# Altium footprint library Power-second_Ver0.1.PcbLib: 16 footprints
Each footprint in its own frame and in the unit in brackets; x right, y up, seen from the top. Pads: shape width x height; smd on the part's side, far side on the other; paste and mask are expansions set on the pad; w line width, h text height; cw(c..) or ccw(c..) is an arc to the next point about the centre after c.
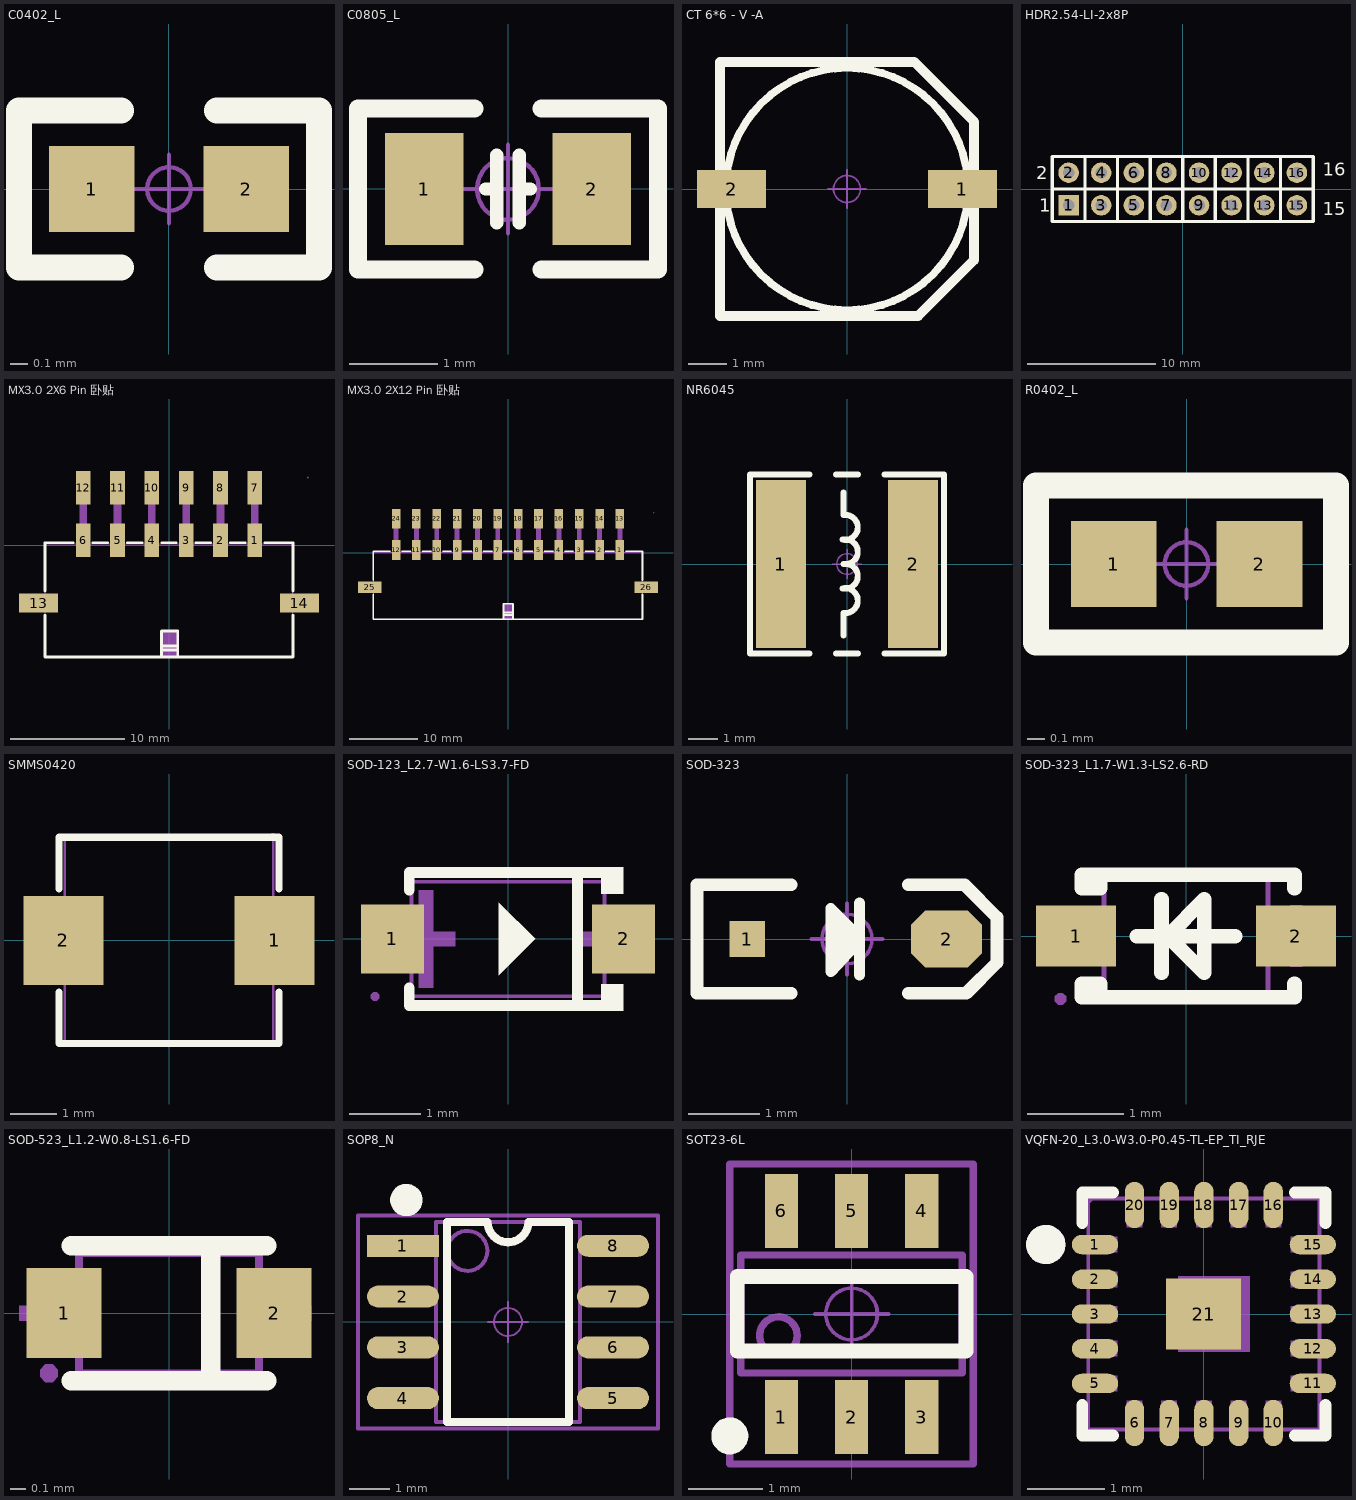
[diagram p0: the footprints below, top view; thin cyan lines are the x and y axes]

## C0402_L [mm] "贴片MLCC电容"
height 1.1
pads (2):
  rect 0.5x0.5 smd: 1(-0.45,0) 2(0.45,0)
Top Overlay:
  lines w0.152: -0.279,-0.457 -0.875,-0.457 -0.875,0.457 -0.279,0.457 ; 0.279,-0.457 0.875,-0.457 0.875,0.457 0.279,0.457
Mechanical 15:
  circle w0.025: c0,0 r0.127
  lines w0.025: -0.2,0 0.2,0 ; 0,-0.2 0,0.2
3D body "C0402-B-2S.stp": height 0.5, standoff 0, extent -0.5,-0.25 0.5,0.25

## C0805_L [mil] "贴片MLCC电容"
height 19.68
pads (2):
  rect 35x50 smd: 1(-37.4,0) 2(37.4,0)
Top Overlay:
  lines w6: -10,0 -5,0 ; -5,-15 -5,15 ; 5,-15 5,15 ; 5,0 10,0
  lines w8: -15,-36 -66.93,-36 -66.93,36 -15,36 ; 15,-36 66.93,-36 66.93,36 15,36
Mechanical 15:
  circle w1.97: c0,0 r13.78
  circle w1.97: c0,0 r13.78
  lines w1.97: -19.68,0 19.68,0 -19.68,0 ; 0,-19.68 0,19.68 0,-19.68
3D body "C0805H13-2S.stp": height 51.18, standoff -0.04, extent -39.36,-25.58 39.38,25.6

## CT 6*6 - V -A [mm] "直径6mm，高6mm"
height 1.1
pads (2):
  rect 1.8x1 smd: 1(3,0) 2(-3,0)
Top Overlay:
  circle w0.2: c0,0 r3.15
  lines w0.254: -3.3,-3.3 1.85,-3.3 3.3,-1.85 3.3,1.75 1.75,3.3 -3.3,3.3 -3.3,-3.3
Mechanical 15:
  circle w0.05: c0,0 r0.35
  lines w0.05: -0.5,0 0.5,0 ; 0,-0.5 0,0.5
3D body "CT 6X6-V.STEP": height 6, standoff -0.01, extent -3.5,-3.15 3.5,3.15

## HDR2.54-LI-2x8P [mm] "双排排针，8x2脚"
pads (16):
  rect 1.6x1.6 hole 0.9: 1(-8.89,-1.27)
  round 1.6 hole 0.9: 2(-8.89,1.27) 3(-6.35,-1.27) 4(-6.35,1.27) 5(-3.81,-1.27) 6(-3.81,1.27) 7(-1.27,-1.27) 8(-1.27,1.27) 9(1.27,-1.27) 10(1.27,1.27) 11(3.81,-1.27) 12(3.81,1.27) 13(6.35,-1.27) 14(6.35,1.27) 15(8.89,-1.27) 16(8.89,1.27)
Top Overlay:
  lines w0.254: -10.16,0 10.16,0 ; -7.62,-2.54 -7.62,2.54 ; -5.08,-2.54 -5.08,2.54 ; -2.54,-2.54 -2.54,2.54 ; 0,-2.54 0,2.54 ; 2.54,-2.54 2.54,2.54 ; 5.08,-2.54 5.08,2.54 ; 7.62,-2.54 7.62,2.54 ; 10.16,-2.54 -10.16,-2.54 -10.16,2.54 10.16,2.54 ; 10.16,-2.54 10.16,2.54 ; 10.16,-2.54 10.16,2.54
  text "15" at 10.922,-2.032 h1.02
  text "16" at 10.922,1.016 h1.02
  text "1" at -11.176,-1.778 h1.02
  text "2" at -11.43,0.762 h1.02
3D body "HDR2.54-1x2P.STEP": height 8.5, standoff -3, extent 7.62,-2.54 10.16,2.54
3D body "HDR2.54-1x2P.STEP": height 8.5, standoff -3, extent 2.54,-2.54 5.08,2.54
3D body "HDR2.54-1x2P.STEP": height 8.5, standoff -3, extent 5.08,-2.54 7.62,2.54
3D body "HDR2.54-1x2P.STEP": height 8.5, standoff -3, extent -5.08,-2.54 -2.54,2.54
3D body "HDR2.54-1x2P.STEP": height 8.5, standoff -3, extent -2.54,-2.54 0,2.54
3D body "HDR2.54-1x2P.STEP": height 8.5, standoff -3, extent -10.16,-2.54 -7.62,2.54
3D body "HDR2.54-1x2P.STEP": height 8.5, standoff -3, extent -7.62,-2.54 -5.08,2.54
3D body "HDR2.54-1x2P.STEP": height 8.5, standoff -3, extent 0,-2.54 2.54,2.54

## MX3.0 2X6 Pin 卧贴 [mm] "MX3.0 2X6 Pin 卧贴"
pads (14):
  rect 1.27x2.92 smd paste+0: 1(7.5,0.43) 2(4.5,0.43) 3(1.5,0.43) 4(-1.5,0.43) 5(-4.5,0.43) 6(-7.5,0.43) 7(7.5,5.05) 8(4.5,5.05) 9(1.5,5.05) 10(-1.5,5.05) 11(-4.5,5.05) 12(-7.5,5.05)
  rect 3.43x1.65 smd paste+0: 13(-11.395,-5.05) 14(11.395,-5.05)
Top Overlay:
  lines w0.254: -10.83,-6.106 -10.83,-9.77 10.83,-9.77 10.83,-6.106 ; -10.83,-3.994 -10.83,0.23 -8.366,0.23 ; -6.634,0.23 -5.366,0.23 ; -3.634,0.23 -2.366,0.23 ; -0.664,-9.77 -0.639,-7.47 0.761,-7.47 0.761,-9.77 ; -0.639,-9.135 0.761,-9.135 ; -0.639,-8.779 0.761,-8.779 ; -0.634,0.23 0.634,0.23 ; 2.366,0.23 3.634,0.23 ; 5.366,0.23 6.634,0.23 ; 8.366,0.23 10.83,0.23 10.83,-3.994
Mechanical 4:
  region: -0.65,-9.75 -0.65,-7.45 0.75,-7.45 0.75,-9.75
Mechanical 7:
  lines w0.051: -10.8,-9.77 10.8,-9.77 10.8,0.13 -10.8,0.13 -10.8,-9.77
Mechanical 8:
  region: -7.82,5.93 -7.18,5.93 -7.18,0.115 -7.82,0.115
  region: -4.82,5.93 -4.18,5.93 -4.18,0.115 -4.82,0.115
  region: -1.82,5.93 -1.18,5.93 -1.18,0.115 -1.82,0.115
  region: 1.18,5.93 1.82,5.93 1.82,0.115 1.18,0.115
  region: 4.18,5.93 4.82,5.93 4.82,0.115 4.18,0.115
  region: 7.18,5.93 7.82,5.93 7.82,0.115 7.18,0.115
Mechanical 9:
  region: 12.19,5.93 12.19,5.905 12.155,5.87 12.105,5.87 12.07,5.905 12.07,5.93 12.07,5.955 12.105,5.99 12.155,5.99 12.19,5.955 12.19,5.93
Mechanical 10:
  region: -10.13,-4.4 -10.13,-5.7 -12.13,-5.7 -12.13,-4.4
  region: 10.13,-5.7 10.13,-4.4 12.13,-4.4 12.13,-5.7
  region: 7.18,1.23 7.82,1.23 7.82,-0.77 7.18,-0.77
  region: 4.18,1.23 4.82,1.23 4.82,-0.77 4.18,-0.77
  region: 4.18,5.93 4.82,5.93 4.82,3.93 4.18,3.93
  region: 1.18,5.93 1.82,5.93 1.82,3.93 1.18,3.93
  region: 1.18,1.23 1.82,1.23 1.82,-0.77 1.18,-0.77
  region: -1.82,1.23 -1.18,1.23 -1.18,-0.77 -1.82,-0.77
  region: -4.82,1.23 -4.18,1.23 -4.18,-0.77 -4.82,-0.77
  region: -7.82,1.23 -7.18,1.23 -7.18,-0.77 -7.82,-0.77
  region: 7.18,5.93 7.82,5.93 7.82,3.93 7.18,3.93
  region: -1.82,5.93 -1.18,5.93 -1.18,3.93 -1.82,3.93
  region: -4.82,5.93 -4.18,5.93 -4.18,3.93 -4.82,3.93
  region: -7.82,5.93 -7.18,5.93 -7.18,3.93 -7.82,3.93
3D body "未命名-EasyEDA PCB Model~QQvAU1~CONN-SMD_12P-P3.00_XKB_C3030WRS-2X06D-LPSW~CONN-SMD_12P-P3.00_XKB_C3030WRS-2X06D-LPSW~irgX.step": height 8.81, standoff -0.01, extent -12.15,-9.678 12.1,6.122

## MX3.0 2X12 Pin 卧贴 [mm] "MX3.0 2X12 Pin 卧贴"
pads (26):
  rect 1.27x2.92 smd paste+0: 1(16.5,0.43) 2(13.5,0.43) 3(10.5,0.43) 4(7.5,0.43) 5(4.5,0.43) 6(1.5,0.43) 7(-1.5,0.43) 8(-4.5,0.43) 9(-7.5,0.43) 10(-10.5,0.43) 11(-13.5,0.43) 12(-16.5,0.43) 13(16.5,5.05) 14(13.5,5.05) 15(10.5,5.05) 16(7.5,5.05) 17(4.5,5.05) 18(1.5,5.05) 19(-1.5,5.05) 20(-4.5,5.05) 21(-7.5,5.05) 22(-10.5,5.05) 23(-13.5,5.05) 24(-16.5,5.05)
  rect 3.43x1.65 smd paste+0: 25(-20.395,-5.05) 26(20.395,-5.05)
Top Overlay:
  lines w0.254: -19.848,-6.106 -19.848,-9.77 19.812,-9.77 19.812,-6.106 ; -19.848,-3.994 -19.848,0.23 -17.366,0.23 ; -15.634,0.23 -14.366,0.23 ; -12.634,0.23 -11.366,0.23 ; -9.634,0.23 -8.366,0.23 ; -6.634,0.23 -5.366,0.23 ; -3.634,0.23 -2.366,0.23 ; -0.677,-9.77 -0.651,-7.47 0.749,-7.47 0.749,-9.77 ; -0.651,-9.135 0.749,-9.135 ; -0.651,-8.779 0.749,-8.779 ; -0.634,0.23 0.634,0.23 ; 2.366,0.23 3.634,0.23 ; 5.366,0.23 6.634,0.23 ; 8.367,0.23 9.634,0.23 ; 11.367,0.23 12.634,0.23 ; 14.366,0.23 15.634,0.23 ; 17.348,0.23 19.812,0.23 19.812,-3.994
Mechanical 4:
  region: -0.6,-7.5 -0.6,-9.7 0.7,-9.7 0.7,-7.5
Mechanical 7:
  lines w0.051: -19.8,-9.77 -19.8,0.13 19.8,0.13 19.8,-9.77 -19.8,-9.77
Mechanical 8:
  region: -16.82,5.93 -16.18,5.93 -16.18,0.03 -16.82,0.03
  region: -13.82,5.93 -13.18,5.93 -13.18,0.03 -13.82,0.03
  region: -10.82,5.93 -10.18,5.93 -10.18,0.03 -10.82,0.03
  region: -7.82,5.93 -7.18,5.93 -7.18,0.03 -7.82,0.03
  region: -4.82,5.93 -4.18,5.93 -4.18,0.03 -4.82,0.03
  region: -1.82,5.93 -1.18,5.93 -1.18,0.03 -1.82,0.03
  region: 1.18,5.93 1.82,5.93 1.82,0.03 1.18,0.03
  region: 4.18,5.93 4.82,5.93 4.82,0.03 4.18,0.03
  region: 7.18,5.93 7.82,5.93 7.82,0.03 7.18,0.03
  region: 10.18,5.93 10.82,5.93 10.82,0.03 10.18,0.03
  region: 13.18,5.93 13.82,5.93 13.82,0.03 13.18,0.03
  region: 16.18,5.93 16.82,5.93 16.82,0.03 16.18,0.03
Mechanical 9:
  region: 21.555,5.93 21.555,5.905 21.52,5.87 21.47,5.87 21.435,5.905 21.435,5.93 21.435,5.955 21.47,5.99 21.52,5.99 21.555,5.955 21.555,5.93
Mechanical 10:
  region: -18.995,-4.4 -18.995,-5.7 -21.495,-5.7 -21.495,-4.4
  region: -13.82,1.23 -13.18,1.23 -13.18,-0.77 -13.82,-0.77
  region: -16.82,1.23 -16.18,1.23 -16.18,-0.77 -16.82,-0.77
  region: -7.82,5.93 -7.18,5.93 -7.18,3.93 -7.82,3.93
  region: -10.82,5.93 -10.18,5.93 -10.18,3.93 -10.82,3.93
  region: -13.82,5.93 -13.18,5.93 -13.18,3.93 -13.82,3.93
  region: -16.82,5.93 -16.18,5.93 -16.18,3.93 -16.82,3.93
  region: -10.82,1.23 -10.18,1.23 -10.18,-0.77 -10.82,-0.77
  region: -7.82,1.23 -7.18,1.23 -7.18,-0.77 -7.82,-0.77
  region: -1.82,1.23 -1.18,1.23 -1.18,-0.77 -1.82,-0.77
  region: -4.82,1.23 -4.18,1.23 -4.18,-0.77 -4.82,-0.77
  region: 4.18,5.93 4.82,5.93 4.82,3.93 4.18,3.93
  region: 1.18,5.93 1.82,5.93 1.82,3.93 1.18,3.93
  region: -1.82,5.93 -1.18,5.93 -1.18,3.93 -1.82,3.93
  region: -4.82,5.93 -4.18,5.93 -4.18,3.93 -4.82,3.93
  region: 1.18,1.23 1.82,1.23 1.82,-0.77 1.18,-0.77
  region: 4.18,1.23 4.82,1.23 4.82,-0.77 4.18,-0.77
  region: 10.18,1.23 10.82,1.23 10.82,-0.77 10.18,-0.77
  region: 7.181,1.23 7.82,1.23 7.82,-0.77 7.181,-0.77
  region: 16.18,5.93 16.82,5.93 16.82,3.93 16.18,3.93
  region: 13.18,5.93 13.82,5.93 13.82,3.93 13.18,3.93
  region: 10.18,5.93 10.82,5.93 10.82,3.93 10.18,3.93
  region: 7.18,5.93 7.82,5.93 7.82,3.93 7.18,3.93
  region: 13.18,1.23 13.82,1.23 13.82,-0.77 13.18,-0.77
  region: 16.18,1.23 16.82,1.23 16.82,-0.77 16.18,-0.77
  region: 18.995,-5.7 18.995,-4.4 21.495,-4.4 21.495,-5.7
3D body "未命名-EasyEDA PCB Model~hzgHU1~CONN-SMD_24P-P3.00_XKB_C3030WRS-2X12D-LPSW~CONN-SMD_24P-P3.00_XKB_C3030WRS-2X12D-LPSW~DUys.step": height 8.75, standoff -0.07, extent -21.125,-9.603 21.125,6.197

## NR6045 [mm] "6.0mm*6.0mm*4.5mm(长*宽*高）"
pads (2):
  rect 1.7x5.7 smd: 1(-2.25,0) 2(2.25,0)
Top Overlay:
  lines w0.203: -1.27,-3.048 -3.302,-3.048 -3.302,3.048 -1.27,3.048 ; -0.381,-3.048 0.381,-3.048 ; -0.381,3.048 0.381,3.048 ; -0.127,-2.424 -0.127,-1.662 ccw(c-0.057,-1.244) -0.149,-0.831 ccw(c-0.057,-0.418) -0.127,0 ccw(c-0.057,0.418) -0.149,0.831 ccw(c-0.057,1.244) -0.127,1.662 -0.127,2.424 ; 1.27,-3.048 3.302,-3.048 3.302,3.048 1.27,3.048
Mechanical 15:
  circle w0.05: c0,0 r0.35
  lines w0.05: -0.5,0 0.5,0 ; 0,-0.5 0,0.5
3D body "NR6045.STEP": height 4.6, standoff 0, extent -3,-3 3,3

## R0402_L [mm] "1/16W贴片电阻"
height 1.1
pads (2):
  rect 0.5x0.5 smd: 1(-0.425,0) 2(0.425,0)
Top Overlay:
  lines w0.152: -0.878,-0.457 0.872,-0.457 0.872,0.457 -0.878,0.457 -0.878,-0.457
Mechanical 15:
  circle w0.025: c0,0 r0.127
  lines w0.025: -0.2,0 0.2,0 ; 0,-0.2 0,0.2
3D body "R0402.STEP": height 0.3, standoff 0, extent -0.5,-0.25 0.5,0.25

## SMMS0420 [mm] "贴片电感"
height 1.1
pads (2):
  rect 1.724x1.92 smd paste+0.051: 1(2.278,0) 2(-2.278,0)
Top Overlay:
  lines w0.152: -2.376,-1.112 -2.376,-2.226 2.376,-2.226 2.376,-1.112 ; -2.376,1.112 -2.376,2.226 2.376,2.226 2.376,1.112
Mechanical 7:
  lines w0.051: -2.25,-2.25 2.25,-2.25 2.25,2.25 -2.25,2.25 -2.25,-2.25
Mechanical 9:
  region: 2.31,2.25 2.31,2.225 2.275,2.19 2.225,2.19 2.19,2.225 2.19,2.25 2.19,2.275 2.225,2.31 2.275,2.31 2.31,2.275 2.31,2.25
Mechanical 10:
  region: -1.575,-0.75 -1.575,0.75 -2.375,0.75 -2.375,-0.75
  region: 1.575,-0.75 1.575,0.75 2.375,0.75 2.375,-0.75
3D body "未命名-EasyEDA PCB Model~xqLhIND-SMD_L4.5-W4.5_SMMS0420~IND-SMD_L4.8-W4.5-H2.0_SMMS0420~0TSv.step": height 2, standoff -0.01, extent -2.375,-2.25 2.375,2.25

## SOD-123_L2.7-W1.6-LS3.7-FD [mm]
pads (2):
  rect 0.88x0.96 smd paste+0.051: 1(-1.61,0) 2(1.61,0)
Top Overlay:
  region: 1.3,-1.003 1.3,-0.632 1.605,-0.633 1.605,-1.003
  region: 1.3,1.002 1.3,0.632 1.605,0.632 1.605,1.002
  region: 0.381,0 -0.127,0.508 -0.127,-0.508
  lines w0.152: -1.376,-0.683 -1.376,-0.926 1.376,-0.926 ; -1.376,0.683 -1.376,0.926 1.376,0.926 ; 0.967,-0.926 0.967,0.926
Mechanical 4:
  region: 1.805,-0.102 1.805,0.102 0.989,0.102 0.989,-0.102
  region: -1.551,-0.102 -1.551,0.102 -0.735,0.102 -0.735,-0.102
  region: -1.245,-0.68 -1.245,0.68 -1.041,0.68 -1.041,-0.68
Mechanical 7:
  lines w0.051: -1.345,-0.8 1.345,-0.8 1.345,0.8 -1.345,0.8 -1.345,-0.8
Mechanical 8:
  region: 1.511,-0.3 1.511,0.3 1.34,0.3 1.34,-0.3
  region: -1.511,0.3 -1.511,-0.3 -1.34,-0.3 -1.34,0.3
Mechanical 9:
  region: -1.791,-0.8 -1.791,-0.825 -1.826,-0.86 -1.876,-0.86 -1.911,-0.825 -1.911,-0.8 -1.911,-0.775 -1.876,-0.74 -1.826,-0.74 -1.791,-0.775 -1.791,-0.8
Mechanical 10:
  region: 1.851,-0.3 1.501,-0.3 1.501,0.3 1.851,0.3
  region: -1.851,0.3 -1.501,0.3 -1.501,-0.3 -1.851,-0.3
3D body "未命名-EasyEDA PCB Model~j9uVD2~SOD-123_L2.7-W1.6-LS3.7-FD~SOD-123_L2.7-W1.6-LS3.7-FD~uSIv.step": height 1.19, standoff 0.01, extent -1.85,-0.775 1.85,0.776

## SOD-323 [mm] "1.8x1.3X0.9mm（长宽高，不包括引脚）"
height 1.1
pads (2):
  rect 0.5x0.5 smd: 1(-1.4,0)
  oct 1x0.8 smd: 2(1.4,0)
Top Overlay:
  lines w0.152: 0.178,-0.508 0.178,0.508 ; 0.178,-0.025 -0.229,-0.457 -0.229,0.432 0.178,0.025
  lines w0.178: -0.787,-0.762 -2.108,-0.762 -2.108,0.762 -0.787,0.762 ; 0.864,-0.762 1.676,-0.762 2.108,-0.33 2.108,0.305 1.651,0.762 0.864,0.762
  lines w0.254: -0.127,0.254 -0.152,-0.178 0.025,-0.025 -0.025,0.127
Mechanical 15:
  circle w0.05: c0,0 r0.35
  lines w0.05: -0.5,0 0.5,0 ; 0,-0.5 0,0.5
3D body "SOD-323.STEP": height 1, standoff 0.04, extent -1.337,-0.631 1.311,0.669

## SOD-323_L1.7-W1.3-LS2.6-RD [mm]
pads (2):
  rect 0.83x0.63 smd paste+0: 1(-1.14,0) 2(1.14,0)
Top Overlay:
  lines w0.152: -1.003,-0.635 -0.986,-0.635 -0.986,-0.495 ; -0.986,0.495 -0.986,0.635 ; -0.508,0 0.508,0 ; -0.254,-0.381 -0.254,0.381 ; 1.125,-0.495 1.125,-0.635 0.889,-0.635 -0.889,-0.635 ; 1.125,0.495 1.125,0.635 0.889,0.635 -0.889,0.635 ; -0.889,-0.635 -0.889,-0.595 -0.889,-0.495 ; -0.889,-0.635 -1.079,-0.635 -1.079,-0.495 -0.889,-0.495 ; -0.889,-0.495 -0.889,-0.495 ; -0.889,0.635 -0.889,0.595 -0.889,0.495 -1.08,0.495 -1.08,0.635 -0.889,0.635 ; -0.191,0 0.191,0.381 0.191,-0.381 -0.191,0
Mechanical 4:
  region: -1.46,0.064 -1.46,-0.064 -0.826,-0.064 -0.826,0.064
  region: 0.826,0.064 0.826,-0.064 1.079,-0.064 1.079,-0.318 1.206,-0.318 1.206,-0.064 1.46,-0.064 1.46,0.064 1.206,0.064 1.206,0.318 1.079,0.318 1.079,0.064
Mechanical 7:
  lines w0.051: -0.85,-0.65 0.85,-0.65 0.85,0.65 -0.85,0.65 -0.85,-0.65
Mechanical 9:
  region: -1.24,-0.65 -1.24,-0.675 -1.275,-0.71 -1.325,-0.71 -1.36,-0.675 -1.36,-0.65 -1.36,-0.625 -1.325,-0.59 -1.275,-0.59 -1.24,-0.625 -1.24,-0.65
Mechanical 10:
  region: 0.8,-0.175 0.8,0.175 1.3,0.175 1.3,-0.175
  region: -1.3,-0.175 -1.3,0.175 -0.8,0.175 -0.8,-0.175
3D body "未命名-EasyEDA PCB Model~j9uVD2~SOD-323_L2.7-W1.6-LS3.7-FD~SOD-123_L2.7-W1.6-LS3.7-FD~uSIv.step": height 0.98, standoff 0.02, extent -1.275,-0.625 1.275,0.625

## SOD-523_L1.2-W0.8-LS1.6-FD [mm]
pads (2):
  rect 0.5x0.6 smd paste+0.051: 1(-0.7,0) 2(0.7,0)
Top Overlay:
  lines w0.13: -0.65,-0.45 0.65,-0.45 ; -0.65,0.45 0.65,0.45 ; 0.279,-0.444 0.279,0.406
Mechanical 4:
  region: -1,0.05 -0.65,0.05 -0.65,-0.05 -1,-0.05
  region: 0.6,0.05 0.95,0.05 0.95,-0.05 0.6,-0.05
  region: -0.876,0.266 -0.776,0.266 -0.776,-0.284 -0.876,-0.284
Mechanical 7:
  lines w0.051: -0.6,-0.4 0.6,-0.4 0.6,0.4 -0.6,0.4 -0.6,-0.4
Mechanical 9:
  region: -0.74,-0.4 -0.74,-0.425 -0.775,-0.46 -0.825,-0.46 -0.86,-0.425 -0.86,-0.4 -0.86,-0.375 -0.825,-0.34 -0.775,-0.34 -0.74,-0.375 -0.74,-0.4
Mechanical 10:
  region: -0.8,0.15 -0.508,0.15 -0.508,-0.15 -0.8,-0.15
  region: 0.8,-0.15 0.508,-0.15 0.508,0.15 0.8,0.15
3D body "未命名-EasyEDA PCB Model~j9uVD2~SOD-523_L2.7-W1.6-LS3.7-FD~SOD-123_L2.7-W1.6-LS3.7-FD~uSIv.step": height 0.72, standoff 0.01, extent -0.8,-0.419 0.8,0.381

## SOP8_N [mm] "5*6*1.8mm（长宽高）"
height 1.75
pads (8):
  rect 1.8x0.55 smd: 1(-2.625,1.905)
  oval 1.8x0.55 smd: 2(-2.625,0.635) 3(-2.625,-0.635) 4(-2.625,-1.905) 5(2.625,-1.905) 6(2.625,-0.635) 7(2.625,0.635) 8(2.625,1.905)
Top Overlay:
  circle w0.5: c-2.54,3.048 r0.155
  lines w0.2: -1.524,2.5 -1.524,-2.5 1.524,-2.5 1.524,2.5
  lines w0.203: -1.524,2.5 -0.508,2.5 ccw(c0,2.5) 0,1.992 ccw(c0,2.5) 0.508,2.5 1.524,2.5
Mechanical 13:
  circle w0.1: c-1.016,1.778 r0.5
  lines w0.1: -1.8,-2.5 -1.8,2.5 1.8,2.5 1.8,-2.5 -1.8,-2.5
Mechanical 15:
  circle w0.05: c0,0 r0.35
  lines w0.05: -0.5,0 0.5,0 ; 0,-0.5 0,0.5
  lines w0.1: -3.75,-2.667 3.75,-2.667 3.75,2.667 -3.75,2.667 -3.75,-2.667
3D body "SOP8.STEP": height 1.9, standoff 0, extent -3.003,-2.5 3.003,2.5

## SOT23-6L [mm] "3x1.6x1.1mm(长宽高)"
height 1.45
pads (6):
  rect 0.45x1 smd: 1(-0.95,-1.397) 2(0,-1.397) 3(0.95,-1.397) 4(0.95,1.397) 5(0,1.397) 6(-0.95,1.397)
Top Overlay:
  circle w0.25: c-1.65,-1.651 r0.125
  lines w0.2: -1.55,-0.5 -1.55,0.508 1.55,0.508 1.55,-0.5 -1.55,-0.5
Mechanical 13:
  circle w0.1: c-0.992,-0.292 r0.254
  lines w0.1: -1.5,-0.8 1.5,-0.8 1.5,0.8 -1.5,0.8 -1.5,-0.8
Mechanical 15:
  circle w0.05: c0,0 r0.35
  lines w0.05: -0.5,0 0.5,0 ; 0,-0.5 0,0.5
  lines w0.1: -1.65,-2.032 1.65,-2.032 1.65,2.032 -1.65,2.032 -1.65,-2.032
3D body "SOT23-6.STEP": height 1.15, standoff -0.03, extent -1.5,-1.404 1.5,1.403

## VQFN-20_L3.0-W3.0-P0.45-TL-EP_TI_RJE [mm]
height 1.1
pads (21):
  oval 0.6x0.252 smd paste-100: 1(-1.412,0.9) 2(-1.412,0.45) 3(-1.412,0) 4(-1.412,-0.45) 5(-1.412,-0.9) 11(1.412,-0.9) 12(1.412,-0.45) 13(1.412,0) 14(1.412,0.45) 15(1.412,0.9)
  oval 0.252x0.6 smd paste-100: 6(-0.9,-1.412) 7(-0.45,-1.412) 8(0,-1.412) 9(0.45,-1.412) 10(0.9,-1.412) 16(0.9,1.412) 17(0.45,1.412) 18(0,1.412) 19(-0.45,1.412) 20(-0.9,1.412)
  rect 0.975x0.926 smd paste-2539.97: 21(-0.004,0)
Top Overlay:
  circle w0.254: c-2.05,0.9 r0.127
  lines w0.152: -1.576,-1.178 -1.576,-1.576 -1.178,-1.576 ; -1.576,1.178 -1.576,1.576 -1.178,1.576 ; 1.178,-1.576 1.576,-1.576 1.576,-1.178 ; 1.178,1.576 1.576,1.576 1.576,1.178
Top Paste:
  drawing of 21 lines, arcs and shapes, not listed
Mechanical 4:
  circle w0.254: c-2.05,0.9 r0.127
Mechanical 7:
  lines w0.051: -1.5,-1.5 1.5,-1.5 1.5,1.5 -1.5,1.5 -1.5,-1.5
Mechanical 9:
  region: -1.5,1.56 -1.475,1.56 -1.44,1.525 -1.44,1.475 -1.475,1.44 -1.5,1.44 -1.525,1.44 -1.56,1.475 -1.56,1.525 -1.525,1.56 -1.5,1.56
Mechanical 10:
  region: -1.5,0.8 -1.125,0.8 -1.125,1 -1.5,1
  region: -1.5,0.35 -1.125,0.35 -1.125,0.55 -1.5,0.55
  region: -1.5,-0.1 -1.125,-0.1 -1.125,0.1 -1.5,0.1
  region: -1.5,-0.55 -1.125,-0.55 -1.125,-0.35 -1.5,-0.35
  region: -1.5,-1 -1.125,-1 -1.125,-0.8 -1.5,-0.8
  region: -1,-1.5 -0.8,-1.5 -0.8,-1.125 -1,-1.125
  region: -0.55,-1.5 -0.35,-1.5 -0.35,-1.125 -0.55,-1.125
  region: -0.1,-1.5 0.1,-1.5 0.1,-1.125 -0.1,-1.125
  region: 0.35,-1.5 0.55,-1.5 0.55,-1.125 0.35,-1.125
  region: 0.8,-1.5 1,-1.5 1,-1.125 0.8,-1.125
  region: 1.5,-1 1.125,-1 1.125,-0.8 1.5,-0.8
  region: 1.5,-0.55 1.125,-0.55 1.125,-0.35 1.5,-0.35
  region: 1.5,-0.1 1.125,-0.1 1.125,0.1 1.5,0.1
  region: 1.5,0.35 1.125,0.35 1.125,0.55 1.5,0.55
  region: 1.5,0.8 1.125,0.8 1.125,1 1.5,1
  region: 0.8,1.5 1,1.5 1,1.125 0.8,1.125
  region: 0.35,1.5 0.55,1.5 0.55,1.125 0.35,1.125
  region: -0.1,1.5 0.1,1.5 0.1,1.125 -0.1,1.125
  region: -0.55,1.5 -0.35,1.5 -0.35,1.125 -0.55,1.125
  region: -1,1.5 -0.8,1.5 -0.8,1.125 -1,1.125
  region: -0.333,0.487 0.593,0.487 0.593,-0.487 -0.333,-0.487
3D body "未命名-EasyEDA PCB Model~MwGMVQFN-20_L3.0-W3.0-P0.45-TL-EP_TI_RJE~VQFN-20_L3.0-W3.0-P0.45-TL-EP_TI_RJE~lDN8.step": height 0.98, standoff -0.03, extent -1.51,-1.51 1.51,1.51